# Altium footprint library PcbLib Semiconductores.PcbLib: 20 footprints (part 1 of 2)
Each footprint in its own frame and in the unit in brackets; x right, y up, seen from the top. Pads: shape width x height; smd on the part's side, far side on the other; paste and mask are expansions set on the pad; w line width, h text height; cw(c..) or ccw(c..) is an arc to the next point about the centre after c.
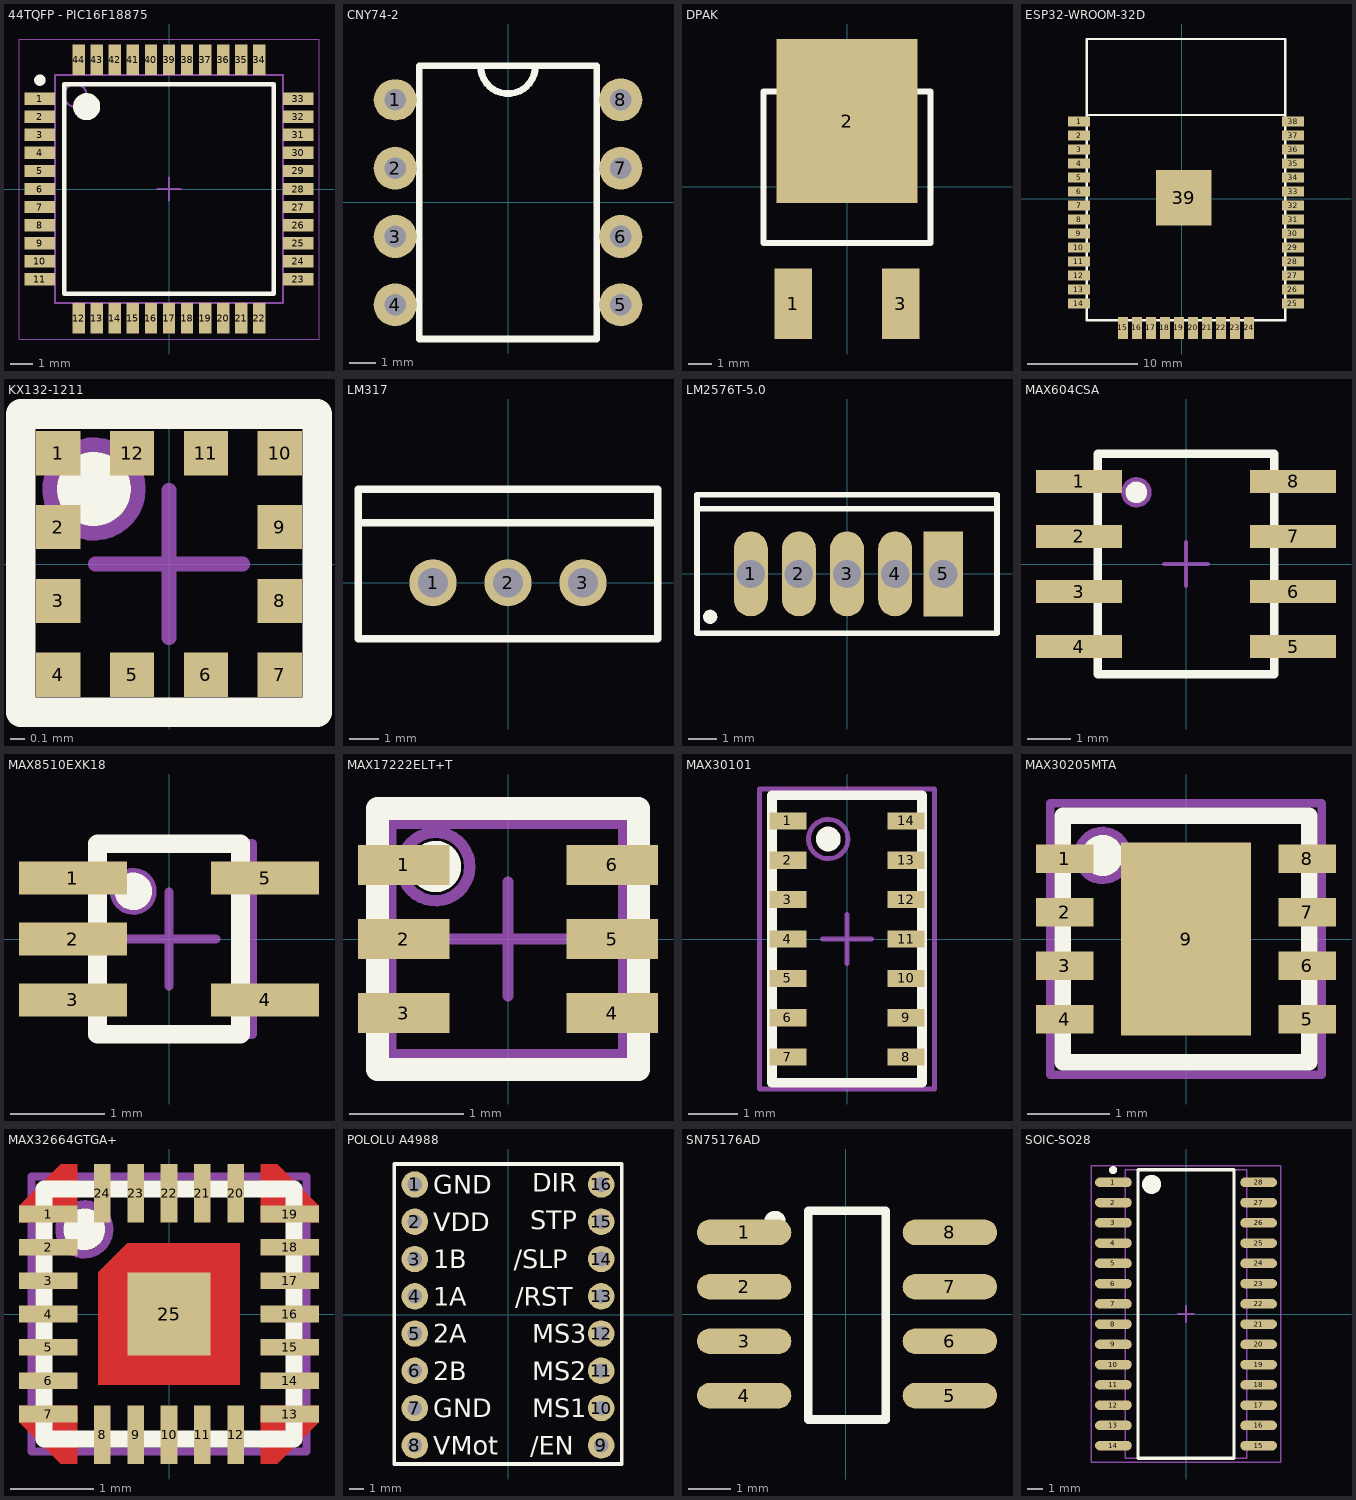
[diagram p0: the footprints below, top view; thin cyan lines are the x and y axes]

## 44TQFP - PIC16F18875 [mm] "PIC16F18875"
pads (44):
  rect 1.35x0.55 smd: 1(-5.725,4) 2(-5.725,3.2) 3(-5.725,2.4) 4(-5.725,1.6) 5(-5.725,0.8) 6(-5.725,0) 7(-5.725,-0.8) 8(-5.725,-1.6) 9(-5.725,-2.4) 10(-5.725,-3.2) 11(-5.725,-4) 23(5.725,-4) 24(5.725,-3.2) 25(5.725,-2.4) 26(5.725,-1.6) 27(5.725,-0.8) 28(5.725,0) 29(5.725,0.8) 30(5.725,1.6) 31(5.725,2.4) 32(5.725,3.2) 33(5.725,4)
  rect 0.55x1.35 smd: 12(-4,-5.725) 13(-3.2,-5.725) 14(-2.4,-5.725) 15(-1.6,-5.725) 16(-0.8,-5.725) 17(0,-5.725) 18(0.8,-5.725) 19(1.6,-5.725) 20(2.4,-5.725) 21(3.2,-5.725) 22(4,-5.725) 34(4,5.725) 35(3.2,5.725) 36(2.4,5.725) 37(1.6,5.725) 38(0.8,5.725) 39(0,5.725) 40(-0.8,5.725) 41(-1.6,5.725) 42(-2.4,5.725) 43(-3.2,5.725) 44(-4,5.725)
Top Overlay:
  circle w0.6: c-3.65,3.65 r0.3
  circle w0.25: c-5.725,4.825 r0.125
  lines w0.2: -4.65,-4.65 4.65,-4.65 4.65,4.65 -4.65,4.65 -4.65,-4.65
Mechanical 13:
  circle w0.1: c-4.15,4.15 r0.5
  lines w0.1: -5.05,-5.05 5.05,-5.05 5.05,5.05 -5.05,5.05 -5.05,-5.05
Mechanical 15:
  lines w0.05: -6.65,-6.65 6.65,-6.65 6.65,6.65 -6.65,6.65 -6.65,-6.65
  lines w0.1: -0.5,0 0.5,0 ; 0,-0.5 0,0.5
3D body "PIC16F18875.stp": height 0.61, standoff -0.7, extent -6,-6 6,6

## CNY74-2 [mm] "OPTOACOPLADOR - CNY74-2"
pads (8):
  oval 1.6x1.524 hole 0.8: 1(-4.191,3.81)
  round 1.6 hole 0.8: 2(-4.191,1.27) 3(-4.191,-1.27) 4(-4.191,-3.81) 5(4.191,-3.81) 6(4.191,-1.27) 7(4.191,1.27) 8(4.191,3.81)
Top Overlay:
  lines w0.254: -1.016,5.068 ccw(c0,5.056) 1.016,5.068 ; -3.302,-5.08 -3.302,5.08 3.302,5.08 3.302,-5.08 -3.302,-5.08
3D body "CNY74-2.stp": height 4.75, standoff -3.3, extent -4.4,-4.85 4.4,4.85

## DPAK [mm] "DPAK"
pads (3):
  rect 1.6x3 smd: 1(-2.285,-5) 3(2.285,-5)
  rect 6x7 smd: 2(0,2.794)
Top Overlay:
  lines w0.254: -3.556,-2.413 3.556,-2.413 3.556,4.064 -3.556,4.064 -3.556,-2.413
3D body "DPAK.stp": height 2.39, standoff 0, extent -3.356,-5.207 3.356,5.207

## ESP32-WROOM-32D [mm] "ESP32-WROOM-32D"
pads (39):
  rect 2x0.9 smd: 1(-9.29,7.01) 2(-9.29,5.74) 3(-9.29,4.47) 4(-9.29,3.2) 5(-9.29,1.93) 6(-9.29,0.66) 7(-9.29,-0.61) 8(-9.29,-1.88) 9(-9.3,-3.15) 10(-9.3,-4.42) 11(-9.3,-5.69) 12(-9.3,-6.96) 13(-9.3,-8.23) 14(-9.3,-9.5) 25(10.1,-9.5) 26(10.1,-8.23) 27(10.1,-6.96) 28(10.1,-5.69) 29(10.1,-4.42) 30(10.1,-3.15) 31(10.11,-1.88) 32(10.11,-0.61) 33(10.11,0.66) 34(10.11,1.93) 35(10.11,3.2) 36(10.11,4.47) 37(10.11,5.74) 38(10.11,7.01)
  rect 0.9x2 smd: 15(-5.31,-11.69) 16(-4.04,-11.69) 17(-2.77,-11.7) 18(-1.5,-11.7) 19(-0.23,-11.7) 20(1.04,-11.7) 21(2.31,-11.7) 22(3.58,-11.7) 23(4.85,-11.7) 24(6.12,-11.7)
  rect 5x5 smd: 39(0.2,0.1)
Top Overlay:
  lines w0.2: -8.6,7.6 9.4,7.6 ; -8.6,-11 -8.6,14.5 9.4,14.5 9.4,-11 -8.6,-11
3D body "ESP-WROOM-32D.step": height 2.91, standoff -0.01, extent -8.492,-11.099 9.508,14.401

## KX132-1211 [mm] "KX132-1211"
pads (12):
  rect 0.3x0.3 smd: 1(-0.75,0.75) 2(-0.75,0.25) 3(-0.75,-0.25) 4(-0.75,-0.75) 5(-0.25,-0.75) 6(0.25,-0.75) 7(0.75,-0.75) 8(0.75,-0.25) 9(0.75,0.25) 10(0.75,0.75) 11(0.25,0.75) 12(-0.25,0.75)
Top Overlay:
  circle w0.25: c-0.508,0.508 r0.125
  circle w0.3: c-0.508,0.508 r0.1
  lines w0.2: -1.003,-1.003 -1.003,1.016 1.003,1.016 1.003,-1.003 -1.003,-1.003
Mechanical 13:
  circle w0.1: c-0.508,0.508 r0.3
  lines w0.1: -1.016,-1.016 -1.016,1.016 1.016,1.016 1.016,-1.016 -1.016,-1.016
Mechanical 15:
  lines w0.05: -1.016,-1.016 -1.016,1.016 1.003,1.016 1.003,-1.016 -1.016,-1.016
  lines w0.1: -0.5,0 0.5,0 ; 0,-0.5 0,0.5
3D body "KX132-1211.step": height 0.99, standoff 0, extent -1.003,-1.003 1.003,1.003

## LM317 [mm] "TO220 - Voltage Regulator -  Adjustable Output, Positive  1.5 A"
pads (3):
  round 1.6 hole 1: 1(-2.54,0) 2(0,0) 3(2.54,0)
Top Overlay:
  lines w0.254: -5.08,2.032 5.08,2.032 ; -5.08,-1.905 -5.08,3.175 5.08,3.175 5.08,-1.905 -5.08,-1.905
3D body "LM317.step": height 18.41, standoff -9.98, extent -5.2,-1.706 5.2,2.794

## LM2576T-5.0 [mm] "LM2576T-5.0 TO220 3A.STEP.DOWN.VOLT.REG."
pads (5):
  oval 1.2x3 hole 1: 1(-3.4,0) 2(-1.7,0) 3(0,0) 4(1.7,0)
  rect 1.4x3 hole 1: 5(3.4,0)
Top Overlay:
  circle w0.25: c-4.834,-1.516 r0.125
  lines w0.2: -5.3,2.3 5.3,2.3 ; -5.3,-2.1 5.3,-2.1 5.3,2.8 -5.3,2.8 -5.3,-2.1
Mechanical 13:
  lines w0.1: -5.3,2.3 5.3,2.3 ; -5.3,-2.1 -5.3,2.8 5.3,2.8 5.3,-2.1 -5.3,-2.1 ; -3.91,-0.28 -3.91,0.28 -2.89,0.28 -2.89,-0.28 -3.91,-0.28 ; -2.21,-0.28 -2.21,0.28 -1.19,0.28 -1.19,-0.28 -2.21,-0.28 ; -0.51,-0.28 -0.51,0.28 0.51,0.28 0.51,-0.28 -0.51,-0.28 ; 1.19,-0.28 1.19,0.28 2.21,0.28 2.21,-0.28 1.19,-0.28 ; 2.89,-0.28 2.89,0.28 3.91,0.28 3.91,-0.28 2.89,-0.28
Mechanical 15:
  lines w0.1: -0.5,0 0.5,0 ; 0,-0.5 0,0.5
3D body "LM2576-5.stp": height 15.4, standoff -3, extent -5.108,-1.908 5.092,2.802

## MAX604CSA [mm] "MAX604CSA+ Low Dropout Linear Regulator"
pads (8):
  rect 1.98x0.53 smd: 1(-2.465,1.905) 2(-2.465,0.635) 3(-2.465,-0.635) 4(-2.465,-1.905) 5(2.465,-1.905) 6(2.465,-0.635) 7(2.465,0.635) 8(2.465,1.905)
Top Overlay:
  circle w0.3: c-1.143,1.651 r0.1
  lines w0.2: -2.032,-2.54 2.032,-2.54 2.032,2.54 -2.032,2.54 -2.032,-2.54
Mechanical 13:
  circle w0.1: c-1.143,1.651 r0.3
  lines w0.1: -2.032,-2.54 2.032,-2.54 2.032,2.54 -2.032,2.54 -2.032,-2.54
Mechanical 15:
  lines w0.05: -2.032,-2.54 2.032,-2.54 2.032,2.54 -2.032,2.54 -2.032,-2.54
  lines w0.1: -0.5,0 0.5,0 ; 0,-0.5 0,0.5
3D body "MAX604CSA.step": height 1.76, standoff 0, extent -3.099,-2.502 3.099,2.502

## MAX8510EXK18 [mm] "MAX8510EXK18 Ultra Low Noise Linear Regulator"
pads (5):
  rect 1.15x0.35 smd: 1(-1.025,0.65) 2(-1.025,0) 3(-1.025,-0.65) 4(1.025,-0.65) 5(1.025,0.65)
Top Overlay:
  circle w0.2: c-0.381,0.508 r0.1
  circle w0.2: c-0.381,0.508 r0.1
  lines w0.2: -0.762,-1.016 0.762,-1.016 0.762,1.016 -0.762,1.016 -0.762,-1.016
Mechanical 13:
  circle w0.1: c-0.381,0.508 r0.2
  lines w0.1: -0.762,-1.016 0.889,-1.016 0.889,1.016 -0.762,1.016 -0.762,-1.016
Mechanical 15:
  lines w0.05: -0.762,-1.016 0.889,-1.016 0.889,1.016 -0.762,1.016 -0.762,-1.016
  lines w0.1: -0.5,0 0.5,0 ; 0,-0.5 0,0.5
3D body "MAX8510EXK18.step": height 1.09, standoff 0, extent -1.194,-1.105 1.194,1.105

## MAX17222ELT+T [mm] "MAX17222ELT+T"
pads (6):
  rect 0.8x0.35 smd: 1(-0.915,0.65) 2(-0.915,0) 3(-0.915,-0.65) 4(0.915,-0.65) 5(0.915,0) 6(0.915,0.65)
Top Overlay:
  circle w0.2: c-0.635,0.635 r0.1
  circle w0.2: c-0.635,0.635 r0.125
  lines w0.2: -1.143,-1.143 1.143,-1.143 1.143,1.143 -1.143,1.143 -1.143,-1.143
Mechanical 13:
  circle w0.1: c-0.635,0.635 r0.3
  lines w0.1: -1.029,-1.016 1.016,-1.016 1.016,1.016 -1.029,1.016 -1.029,-1.016
Mechanical 15:
  lines w0.05: -1.016,-1.016 1.016,-1.016 1.016,1.016 -1.016,1.016 -1.016,-1.016
  lines w0.1: -0.5,0 0.5,0 ; 0,-0.5 0,0.5
3D body "MAX17222ELT+T.step": height 0.81, standoff 0, extent -1.029,-1.029 1.029,1.029

## MAX30101 [mm] "MAX30101"
pads (14):
  rect 0.75x0.35 smd: 1(-1.2,2.4) 2(-1.2,1.6) 3(-1.2,0.8) 4(-1.2,0) 5(-1.2,-0.8) 6(-1.2,-1.6) 7(-1.2,-2.4) 8(1.2,-2.4) 9(1.2,-1.6) 10(1.2,-0.8) 11(1.2,0) 12(1.2,0.8) 13(1.2,1.6) 14(1.2,2.4)
Top Overlay:
  circle w0.25: c-0.381,2.032 r0.125
  circle w0.3: c-0.381,2.032 r0.1
  lines w0.2: -1.524,-2.921 -1.524,2.921 1.524,2.921 1.524,-2.921 -1.524,-2.921
Mechanical 13:
  circle w0.1: c-0.381,2.032 r0.4
  lines w0.1: -1.778,-3.048 -1.778,3.048 1.778,3.048 1.778,-3.048 -1.778,-3.048
Mechanical 15:
  lines w0.05: -1.778,-3.048 -1.778,3.048 1.778,3.048 1.778,-3.048 -1.778,-3.048
  lines w0.1: -0.5,0 0.5,0 ; 0,-0.5 0,0.5
3D body "MAX30101.step": height 1.3, standoff 0, extent -1.448,-2.845 1.448,2.845

## MAX30205MTA [mm] "MAX30205MTA"
pads (9):
  rect 0.7x0.35 smd: 1(-1.475,0.975) 2(-1.475,0.325) 3(-1.475,-0.325) 4(-1.475,-0.975) 5(1.475,-0.975) 6(1.475,-0.325) 7(1.475,0.325) 8(1.475,0.975)
  rect 1.58x2.35 smd: 9(0,0)
Top Overlay:
  circle w0.3: c-1.016,1.016 r0.1
  circle w0.25: c-1.016,1.016 r0.125
  lines w0.2: -1.5,-1.5 1.5,-1.5 1.5,1.5 -1.5,1.5 -1.5,-1.5
Mechanical 13:
  circle w0.1: c-1.016,1.016 r0.3
  lines w0.1: -1.651,-1.651 1.651,-1.651 1.651,1.651 -1.651,1.651 -1.651,-1.651
Mechanical 15:
  lines w0.05: -1.651,-1.651 1.651,-1.651 1.651,1.651 -1.651,1.651 -1.651,-1.651
  lines w0.1: -0.5,0 0.5,0 ; 0,-0.5 0,0.5
3D body "MAX30205MTA.stp": height 0.75, standoff -0.05, extent -1.535,-1.5 1.535,1.5

## MAX32664GTGA+ [mm] "MAX32664GTGA+"
pads (25):
  rect 0.7x0.2 smd: 1(-1.45,1.2) 2(-1.45,0.8) 3(-1.45,0.4) 4(-1.45,0) 5(-1.45,-0.4) 6(-1.45,-0.8) 7(-1.45,-1.2) 13(1.45,-1.2) 14(1.45,-0.8) 15(1.45,-0.4) 16(1.45,0) 17(1.45,0.4) 18(1.45,0.8) 19(1.45,1.2)
  rect 0.2x0.7 smd: 8(-0.8,-1.45) 9(-0.4,-1.45) 10(0,-1.45) 11(0.4,-1.45) 12(0.8,-1.45) 20(0.8,1.45) 21(0.4,1.45) 22(0,1.45) 23(-0.4,1.45) 24(-0.8,1.45)
  rect 1x1 smd: 25(0,0)
Top Layer:
  region: -1.1,-1.1 -1.8,-1.1 -1.8,-1.3 -1.3,-1.8 -1.1,-1.8
  region: 1.1,-1.1 1.1,-1.8 1.3,-1.8 1.8,-1.3 1.8,-1.1
  region: 1.1,1.1 1.8,1.1 1.8,1.3 1.3,1.8 1.1,1.8
  region: -1.1,1.1 -1.1,1.8 -1.3,1.8 -1.8,1.3 -1.8,1.1
  region: 0.85,-0.85 0.85,0.85 -0.5,0.85 -0.85,0.5 -0.85,-0.85
Top Overlay:
  circle w0.3: c-1.016,1.016 r0.1
  circle w0.25: c-1.016,1.016 r0.125
  lines w0.2: -1.5,-1.5 1.5,-1.5 1.5,1.5 -1.5,1.5 -1.5,-1.5
Mechanical 13:
  circle w0.1: c-1.016,1.016 r0.3
  lines w0.1: -1.651,-1.651 1.651,-1.651 1.651,1.651 -1.651,1.651 -1.651,-1.651
Mechanical 15:
  lines w0.05: -1.651,-1.651 1.651,-1.651 1.651,1.651 -1.651,1.651 -1.651,-1.651
  lines w0.1: -0.5,0 0.5,0 ; 0,-0.5 0,0.5
3D body "MAX32664GTGA+.stp": height 0.8, standoff 0, extent -1.535,-1.535 1.535,1.535

## POLOLU A4988 [mm] "POLOLU A4988 - STEPPER MOTOR DRIVER"
pads (16):
  round 1.8 hole 1: 1(-6.35,8.89) 2(-6.35,6.35) 3(-6.35,3.81) 4(-6.35,1.27) 5(-6.35,-1.27) 6(-6.35,-3.81) 7(-6.35,-6.35) 8(-6.35,-8.89) 9(6.35,-8.89) 10(6.35,-6.35) 11(6.35,-3.81) 12(6.35,-1.27) 13(6.35,1.27) 14(6.35,3.81) 15(6.35,6.35) 16(6.35,8.89)
Top Overlay:
  lines w0.254: -7.747,-10.16 -7.747,10.287 7.747,10.287 7.747,-10.16 -7.747,-10.16
  text "GND" at -5.08,8.255 h1.27
  text "DIR" at 1.651,8.382 h1.27
  text "STP" at 1.524,5.842 h1.27
  text "/SLP" at 0.381,3.175 h1.27
  text "/RST" at 0.508,0.635 h1.27
  text "MS3" at 1.651,-1.905 h1.27
  text "MS2" at 1.651,-4.445 h1.27
  text "MS1" at 1.651,-6.985 h1.27
  text "/EN" at 1.524,-9.525 h1.27
  text "VMot" at -5.08,-9.525 h1.27
  text "GND" at -5.08,-6.985 h1.27
  text "2B" at -5.08,-4.445 h1.27
  text "2A" at -5.08,-1.905 h1.27
  text "1A" at -5.08,0.635 h1.27
  text "1B" at -5.08,3.175 h1.27
  text "VDD" at -5.08,5.715 h1.27
3D body "POLOLU-A4899.stp": height 8.78, standoff -3.97, extent -7.493,-10.287 7.747,10.033

## SN75176AD [mm] "SN75176AD - Differential Bus Transceiver"
pads (8):
  oval 2.2x0.6 smd: 1(-2.371,1.905) 2(-2.371,0.635) 3(-2.371,-0.635) 4(-2.371,-1.905) 5(2.429,-1.905) 6(2.429,-0.635) 7(2.429,0.635) 8(2.429,1.905)
Top Overlay:
  circle w0.25: c-1.651,2.159 r0.125
  lines w0.2: -0.871,-2.461 0.929,-2.461 0.929,2.413 -0.871,2.413 -0.871,-2.461
3D body "SN7517AD.stp": height 1.75, standoff 0, extent -2.89,-2.45 2.89,2.45

## SOIC-SO28 [mm] "PIC16F18854 SOIC, 28-Leads, Body 17.9x7.5mm, Pitch 1.27mm,"
height 2.65
pads (28):
  oval 2.3x0.6 smd: 1(-4.55,8.255) 2(-4.55,6.985) 3(-4.55,5.715) 4(-4.55,4.445) 5(-4.55,3.175) 6(-4.55,1.905) 7(-4.55,0.635) 8(-4.55,-0.635) 9(-4.55,-1.905) 10(-4.55,-3.175) 11(-4.55,-4.445) 12(-4.55,-5.715) 13(-4.55,-6.985) 14(-4.55,-8.255) 15(4.55,-8.255) 16(4.55,-6.985) 17(4.55,-5.715) 18(4.55,-4.445) 19(4.55,-3.175) 20(4.55,-1.905) 21(4.55,-0.635) 22(4.55,0.635) 23(4.55,1.905) 24(4.55,3.175) 25(4.55,4.445) 26(4.55,5.715) 27(4.55,6.985) 28(4.55,8.255)
Top Overlay:
  circle w0.25: c-4.572,9.017 r0.125
  circle w0.6: c-2.159,8.128 r0.3
  lines w0.2: -3,-9.05 -3,9.05 3,9.05 3,-9.05 -3,-9.05
Mechanical 13:
  circle w0.1: c-2.159,8.128 r0.5
  lines w0.1: -3.8,-9.055 -3.8,9.055 3.8,9.055 3.8,-9.055 -3.8,-9.055
Mechanical 15:
  lines w0.1: -0.5,0 0.5,0 ; 0,-0.5 0,0.5 ; -5.95,-9.3 -5.95,9.3 5.95,9.3 5.95,-9.3 -5.95,-9.3
3D body "PIC16F18854.stp": height 1.75, standoff 0, extent -5.24,-9 5.24,9